# Altium footprint library LibPCB.PcbLib: 76 footprints (part 4 of 5)
Each footprint in its own frame and in the unit in brackets; x right, y up, seen from the top. Pads: shape width x height; smd on the part's side, far side on the other; paste and mask are expansions set on the pad; w line width, h text height; cw(c..) or ccw(c..) is an arc to the next point about the centre after c.
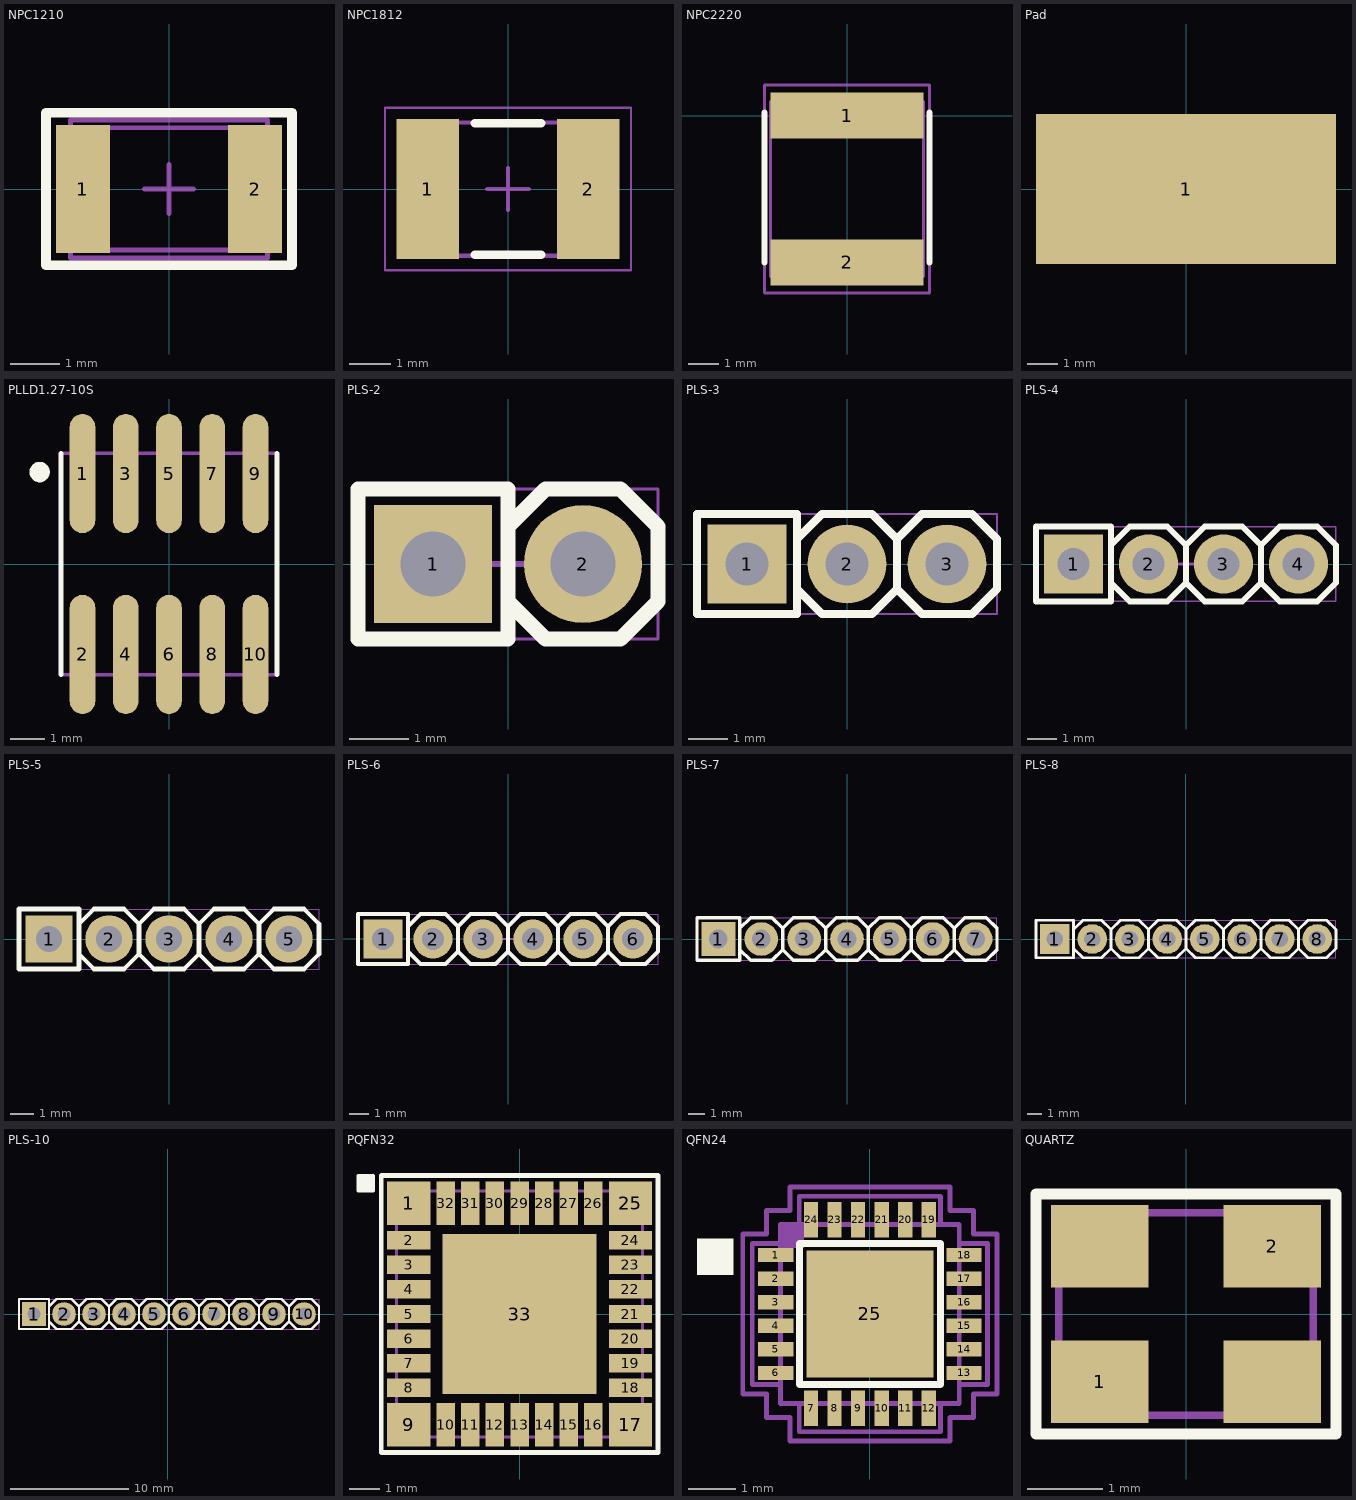
[diagram p3: the footprints below, top view; thin cyan lines are the x and y axes]

## NPC1210 [mm] "Non polar chip capacitor, size 1210"
height 2.5
pads (2):
  rect 1.1x2.6 smd: 1(-1.75,0) 2(1.75,0)
Top Overlay:
  lines w0.2: -2.5,-1.55 2.5,-1.55 2.5,1.55 -2.5,1.55 -2.5,-1.55
Mechanical 1:
  lines w0.1: -2,-1.244 -2,1.245 2,1.245 2,-1.244 -2,-1.244
Mechanical 9:
  text ".Comment" at -1.054,-0.651 h0.6
  text ".Designator" at -1.454,0.049 h0.8
Mechanical 11:
  lines w0.1: -2,-1.4 -2,1.4 2,1.4 2,-1.4 -2,-1.4
Mechanical 15:
  lines w0.1: -0.5,0 0.5,0 ; 0,-0.5 0,0.5
3D body "User Library-1210(3225M) Cap.STEP": height 1.7, standoff 0, extent -2,-1.244 2,1.245

## NPC1812 [mm] "Non polar chip capacitor, size 1812"
height 1.4
pads (2):
  rect 1.5x3.35 smd: 1(-1.925,0) 2(1.925,0)
Top Overlay:
  lines w0.2: -0.8,-1.575 0.8,-1.575 ; -0.8,1.575 0.8,1.575
Mechanical 1:
  lines w0.1: -2.25,-1.6 -2.25,1.6 2.25,1.6 2.25,-1.6 -2.25,-1.6
Mechanical 9:
  text ".Comment" at -1.054,-0.651 h0.6
  text ".Designator" at -1.454,0.049 h0.8
Mechanical 11:
  lines w0.05: -2.95,-1.95 -2.95,1.95 2.95,1.95 2.95,-1.95 -2.95,-1.95
Mechanical 15:
  lines w0.1: -0.5,0 0.5,0 ; 0,-0.5 0,0.5
3D body "SW3dPS-1812 SMD Capacitor.STEP": height 1.6, standoff 0, extent -2.25,-1.6 2.25,1.6

## NPC2220 [mm] "Non polar chip capacitor, size 2220"
pads (2):
  rect 5x1.5 smd: 1(0,0) 2(0,-4.8)
Top Overlay:
  lines w0.2: -2.7,-4.8 -2.7,0.1 ; 2.7,-4.8 2.7,0.1
Mechanical 1:
  lines w0.1: -2.5,-5.25 -2.5,0.45 2.5,0.45 2.5,-5.25 -2.5,-5.25
Mechanical 9:
  text ".Comment" at -1.054,-3.064 h0.6
  text ".Designator" at -1.454,-2.364 h0.8
Mechanical 11:
  lines w0.1: -2.7,-5.8 -2.7,1 -2,1 2.7,1 2.7,-5.8 -2.7,-5.8
3D body "User Library-CAPC5750X23.STEP": height 2.3, standoff 0, extent -2.5,-5.25 2.5,0.45

## Pad [mm]
pads (1):
  rect 10x5 smd mask+0: 1(0,0)

## PLLD1.27-10S [mm] "PLDD-1.27"
height 5
pads (10):
  oval 0.75x3.5 smd: 1(-2.54,2.655) 2(-2.54,-2.655) 3(-1.27,2.655) 4(-1.27,-2.655) 5(0,2.655) 6(0,-2.655) 7(1.27,2.655) 8(1.27,-2.655) 9(2.54,2.655) 10(2.54,-2.655)
Top Overlay:
  circle w0.3: c-3.8,2.7 r0.15
  lines w0.15: -3.175,-3.25 -3.175,3.25 ; 3.175,-3.25 3.175,3.25
Mechanical 7:
  lines w0.1: -3.175,-3.25 3.175,-3.25 3.175,3.25 -3.175,3.25 -3.175,-3.25
3D body: height 5, standoff 0, extent -3.175,-3.25 3.175,3.25

## PLS-2 [mm]
height 10
pads (2):
  rect 2x2 hole 1.1: 1(-1.27,0)
  round 2 hole 1.1: 2(1.27,0)
Top Overlay:
  lines w0.254: 0,-0.635 0.635,-1.27 1.905,-1.27 2.54,-0.635 2.54,0.635 1.905,1.27 0.635,1.27 0,0.635 ; -2.54,-1.27 -2.54,1.27 0,1.27 0,-1.27 -2.54,-1.27
Mechanical 1:
  lines w0.1: 0,-0.635 0.635,-1.27 1.905,-1.27 2.54,-0.635 2.54,0.635 1.905,1.27 0.635,1.27 0,0.635 ; -2.54,-1.27 0,-1.27 0,1.27 -2.54,1.27 -2.54,-1.27
Mechanical 15:
  lines w0.05: -2.54,-1.27 2.54,-1.27 2.54,1.27 -2.54,1.27 -2.54,-1.27
  lines w0.1: -0.5,0 0.5,0 ; 0,-0.5 0,0.5
3D body "PLS-2.STEP": height 8.54, standoff -3, extent -2.573,-1.284 2.507,1.256

## PLS-3 [mm]
height 10
pads (3):
  rect 2x2 hole 1.1: 1(-2.54,0)
  round 2 hole 1.1: 2(0,0) 3(2.54,0)
Top Overlay:
  lines w0.2: -1.27,-0.635 -0.635,-1.27 0.635,-1.27 1.27,-0.635 ; -1.27,0.635 -0.635,1.27 0.635,1.27 1.27,0.635 ; 1.27,-0.635 1.27,0.635 ; 1.27,-0.635 1.905,-1.27 3.175,-1.27 3.81,-0.635 3.81,0.635 3.175,1.27 1.905,1.27 1.27,0.635 ; -3.81,-1.27 -3.81,1.27 -1.27,1.27 -1.27,-1.27 -3.81,-1.27
Mechanical 1:
  lines w0.1: -1.27,-0.635 -0.635,-1.27 0.635,-1.27 1.27,-0.635 ; -1.27,0.635 -0.635,1.27 0.635,1.27 1.27,0.635 ; 1.27,-0.635 1.905,-1.27 3.175,-1.27 3.81,-0.635 3.81,0.635 3.175,1.27 1.905,1.27 1.27,0.635 ; 1.27,-0.635 1.27,0.635 ; -3.81,-1.27 -1.27,-1.27 -1.27,1.27 -3.81,1.27 -3.81,-1.27
Mechanical 15:
  lines w0.05: -3.81,-1.27 3.81,-1.27 3.81,1.27 -3.81,1.27 -3.81,-1.27
  lines w0.1: -0.5,0 0.5,0 ; 0,-0.5 0,0.5
3D body "PLS-3.STEP": height 8.54, standoff -3, extent -3.81,-1.27 3.81,1.27

## PLS-4 [mm]
height 10
pads (4):
  rect 2x2 hole 1.1: 1(-3.81,0)
  round 2 hole 1.1: 2(-1.27,0) 3(1.27,0) 4(3.81,0)
Top Overlay:
  lines w0.2: -2.54,-0.635 -1.905,-1.27 -0.635,-1.27 0,-0.635 ; -2.54,0.635 -1.905,1.27 -0.635,1.27 0,0.635 ; 0,-0.635 0,0.635 ; 0,-0.635 0.635,-1.27 1.905,-1.27 2.54,-0.635 ; 0,0.635 0.635,1.27 1.905,1.27 2.54,0.635 ; 2.54,-0.635 2.54,0.635 ; 2.54,-0.635 3.175,-1.27 4.445,-1.27 5.08,-0.635 5.08,0.635 4.445,1.27 3.175,1.27 2.54,0.635 ; -5.08,-1.27 -5.08,1.27 -2.54,1.27 -2.54,-1.27 -5.08,-1.27
Mechanical 1:
  lines w0.1: -2.54,-0.635 -1.905,-1.27 -0.635,-1.27 0,-0.635 ; -2.54,0.635 -1.905,1.27 -0.635,1.27 0,0.635 ; 0,-0.635 0.635,-1.27 1.905,-1.27 2.54,-0.635 ; 0,-0.635 0,0.635 ; 0,0.635 0.635,1.27 1.905,1.27 2.54,0.635 ; 2.54,-0.635 3.175,-1.27 4.445,-1.27 5.08,-0.635 5.08,0.635 4.445,1.27 3.175,1.27 2.54,0.635 ; 2.54,-0.635 2.54,0.635 ; -5.08,-1.27 -2.54,-1.27 -2.54,1.27 -5.08,1.27 -5.08,-1.27
Mechanical 15:
  lines w0.05: -5.08,-1.27 5.08,-1.27 5.08,1.27 -5.08,1.27 -5.08,-1.27
  lines w0.1: -0.5,0 0.5,0 ; 0,-0.5 0,0.5
3D body "PLS-4.STEP": height 8.54, standoff -3, extent -5.08,-1.27 5.08,1.27

## PLS-5 [mm]
height 10
pads (5):
  rect 2x2 hole 1.1: 1(-5.08,0)
  round 2 hole 1.1: 2(-2.54,0) 3(0,0) 4(2.54,0) 5(5.08,0)
Top Overlay:
  lines w0.2: -3.81,-0.635 -3.175,-1.27 -1.905,-1.27 -1.27,-0.635 ; -3.81,0.635 -3.175,1.27 -1.905,1.27 -1.27,0.635 ; -1.27,-0.635 -0.635,-1.27 0.635,-1.27 1.27,-0.635 ; -1.27,-0.635 -1.27,0.635 ; -1.27,0.635 -0.635,1.27 0.635,1.27 1.27,0.635 ; 1.27,-0.635 1.905,-1.27 3.175,-1.27 3.81,-0.635 ; 1.27,-0.635 1.27,0.635 ; 1.27,0.635 1.905,1.27 3.175,1.27 3.81,0.635 ; 3.81,-0.635 4.445,-1.27 5.715,-1.27 6.35,-0.635 6.35,0.635 5.715,1.27 4.445,1.27 3.81,0.635 ; 3.81,-0.635 3.81,0.635 ; -6.35,-1.27 -3.81,-1.27 -3.81,1.27 -6.35,1.27 -6.35,-1.27
Mechanical 1:
  lines w0.1: -3.81,-0.635 -3.175,-1.27 -1.905,-1.27 -1.27,-0.635 ; -3.81,0.635 -3.175,1.27 -1.905,1.27 -1.27,0.635 ; -1.27,-0.635 -1.27,0.635 ; -1.27,-0.635 -0.635,-1.27 0.635,-1.27 1.27,-0.635 ; -1.27,0.635 -0.635,1.27 0.635,1.27 1.27,0.635 ; 1.27,-0.635 1.27,0.635 ; 1.27,-0.635 1.905,-1.27 3.175,-1.27 3.81,-0.635 ; 1.27,0.635 1.905,1.27 3.175,1.27 3.81,0.635 ; 3.81,-0.635 3.81,0.635 ; 3.81,-0.635 4.445,-1.27 5.715,-1.27 6.35,-0.635 6.35,0.635 5.715,1.27 4.445,1.27 3.81,0.635 ; -6.35,-1.27 -6.35,1.27 -3.81,1.27 -3.81,-1.27 -6.35,-1.27
Mechanical 15:
  lines w0.05: -6.35,-1.27 -6.35,1.27 6.35,1.27 6.35,-1.27 -6.35,-1.27
  lines w0.1: -0.5,0 0.5,0 ; 0,-0.5 0,0.5
3D body "PLS-5.STEP": height 8.54, standoff -3, extent -6.35,-1.27 6.35,1.27

## PLS-6 [mm]
height 10
pads (6):
  rect 2x2 hole 1.1: 1(-6.35,0)
  round 2 hole 1.1: 2(-3.81,0) 3(-1.27,0) 4(1.27,0) 5(3.81,0) 6(6.35,0)
Top Overlay:
  lines w0.2: -5.08,-0.635 -4.445,-1.27 -3.175,-1.27 -2.54,-0.635 ; -5.08,0.635 -4.445,1.27 -3.175,1.27 -2.54,0.635 ; -2.54,-0.635 -2.54,0.635 ; -2.54,-0.635 -1.905,-1.27 -0.635,-1.27 0,-0.635 ; -2.54,0.635 -1.905,1.27 -0.635,1.27 0,0.635 ; 0,-0.635 0,0.635 ; 0,-0.635 0.635,-1.27 1.905,-1.27 2.54,-0.635 ; 0,0.635 0.635,1.27 1.905,1.27 2.54,0.635 ; 2.54,-0.635 2.54,0.635 ; 2.54,-0.635 3.175,-1.27 4.445,-1.27 5.08,-0.635 ; 2.54,0.635 3.175,1.27 4.445,1.27 5.08,0.635 ; 5.08,-0.635 5.715,-1.27 6.985,-1.27 7.62,-0.635 7.62,0.635 6.985,1.27 5.715,1.27 5.08,0.635 ; 5.08,-0.635 5.08,0.635 ; -7.62,-1.27 -7.62,1.27 -5.08,1.27 -5.08,-1.27 -7.62,-1.27
Mechanical 1:
  lines w0.1: -5.08,-0.635 -4.445,-1.27 -3.175,-1.27 -2.54,-0.635 ; -5.08,0.635 -4.445,1.27 -3.175,1.27 -2.54,0.635 ; -2.54,-0.635 -1.905,-1.27 -0.635,-1.27 0,-0.635 ; -2.54,-0.635 -2.54,0.635 ; -2.54,0.635 -1.905,1.27 -0.635,1.27 0,0.635 ; 0,-0.635 0.635,-1.27 1.905,-1.27 2.54,-0.635 ; 0,-0.635 0,0.635 ; 0,0.635 0.635,1.27 1.905,1.27 2.54,0.635 ; 2.54,-0.635 3.175,-1.27 4.445,-1.27 5.08,-0.635 ; 2.54,-0.635 2.54,0.635 ; 2.54,0.635 3.175,1.27 4.445,1.27 5.08,0.635 ; 5.08,-0.635 5.08,0.635 ; 5.08,-0.635 5.715,-1.27 6.985,-1.27 7.62,-0.635 7.62,0.635 6.985,1.27 5.715,1.27 5.08,0.635 ; -7.62,-1.27 -5.08,-1.27 -5.08,1.27 -7.62,1.27 -7.62,-1.27
Mechanical 15:
  lines w0.05: -7.62,-1.27 7.62,-1.27 7.62,1.27 -7.62,1.27 -7.62,-1.27
  lines w0.1: -0.5,0 0.5,0 ; 0,-0.5 0,0.5
3D body "PLS-6.STEP": height 8.54, standoff -3, extent -7.62,-1.27 7.62,1.27

## PLS-7 [mm]
height 10
pads (7):
  rect 2x2 hole 1.1: 1(-7.62,0)
  round 2 hole 1.1: 2(-5.08,0) 3(-2.54,0) 4(0,0) 5(2.54,0) 6(5.08,0) 7(7.62,0)
Top Overlay:
  lines w0.2: -6.35,-0.635 -5.715,-1.27 -4.445,-1.27 -3.81,-0.635 ; -6.35,0.635 -5.715,1.27 -4.445,1.27 -3.81,0.635 ; -3.81,-0.635 -3.175,-1.27 -1.905,-1.27 -1.27,-0.635 ; -3.81,-0.635 -3.81,0.635 ; -3.81,0.635 -3.175,1.27 -1.905,1.27 -1.27,0.635 ; -1.27,-0.635 -0.635,-1.27 0.635,-1.27 1.27,-0.635 ; -1.27,-0.635 -1.27,0.635 ; -1.27,0.635 -0.635,1.27 0.635,1.27 1.27,0.635 ; 1.27,-0.635 1.905,-1.27 3.175,-1.27 3.81,-0.635 ; 1.27,-0.635 1.27,0.635 ; 1.27,0.635 1.905,1.27 3.175,1.27 3.81,0.635 ; 3.81,-0.635 3.81,0.635 ; 3.81,-0.635 4.445,-1.27 5.715,-1.27 6.35,-0.635 ; 3.81,0.635 4.445,1.27 5.715,1.27 6.35,0.635 ; 6.35,-0.635 6.985,-1.27 8.255,-1.27 8.89,-0.635 8.89,0.635 8.255,1.27 6.985,1.27 6.35,0.635 ; 6.35,-0.635 6.35,0.635 ; -8.89,-1.27 -6.35,-1.27 -6.35,1.27 -8.89,1.27 -8.89,-1.27
Mechanical 1:
  lines w0.1: -6.35,-0.635 -5.715,-1.27 -4.445,-1.27 -3.81,-0.635 ; -6.35,0.635 -5.715,1.27 -4.445,1.27 -3.81,0.635 ; -3.81,-0.635 -3.81,0.635 ; -3.81,-0.635 -3.175,-1.27 -1.905,-1.27 -1.27,-0.635 ; -3.81,0.635 -3.175,1.27 -1.905,1.27 -1.27,0.635 ; -1.27,-0.635 -1.27,0.635 ; -1.27,-0.635 -0.635,-1.27 0.635,-1.27 1.27,-0.635 ; -1.27,0.635 -0.635,1.27 0.635,1.27 1.27,0.635 ; 1.27,-0.635 1.27,0.635 ; 1.27,-0.635 1.905,-1.27 3.175,-1.27 3.81,-0.635 ; 1.27,0.635 1.905,1.27 3.175,1.27 3.81,0.635 ; 3.81,-0.635 4.445,-1.27 5.715,-1.27 6.35,-0.635 ; 3.81,-0.635 3.81,0.635 ; 3.81,0.635 4.445,1.27 5.715,1.27 6.35,0.635 ; 6.35,-0.635 6.35,0.635 ; 6.35,-0.635 6.985,-1.27 8.255,-1.27 8.89,-0.635 8.89,0.635 8.255,1.27 6.985,1.27 6.35,0.635 ; -8.89,-1.27 -8.89,1.27 -6.35,1.27 -6.35,-1.27 -8.89,-1.27
Mechanical 15:
  lines w0.05: -8.89,-1.27 -8.89,1.27 8.89,1.27 8.89,-1.27 -8.89,-1.27
  lines w0.1: -0.5,0 0.5,0 ; 0,-0.5 0,0.5

## PLS-8 [mm]
height 10
pads (8):
  rect 2x2 hole 1.1: 1(-8.884,0.004)
  round 2 hole 1.1: 2(-6.344,0.004) 3(-3.804,0.004) 4(-1.264,0.004) 5(1.276,0.004) 6(3.816,0.004) 7(6.356,0.004) 8(8.896,0.004)
Top Overlay:
  lines w0.2: -7.614,-0.631 -6.979,-1.266 -5.709,-1.266 -5.074,-0.631 ; -7.614,0.639 -6.979,1.274 -5.709,1.274 -5.074,0.639 ; -5.074,-0.631 -5.074,0.639 ; -5.074,-0.631 -4.439,-1.266 -3.169,-1.266 -2.534,-0.631 ; -5.074,0.639 -4.439,1.274 -3.169,1.274 -2.534,0.639 ; -2.534,-0.631 -2.534,0.639 ; -2.534,-0.631 -1.899,-1.266 -0.629,-1.266 0.006,-0.631 ; -2.534,0.639 -1.899,1.274 -0.629,1.274 0.006,0.639 ; 0.006,-0.631 0.006,0.639 ; 0.006,-0.631 0.641,-1.266 1.911,-1.266 2.546,-0.631 ; 0.006,0.639 0.641,1.274 1.911,1.274 2.546,0.639 ; 2.546,-0.631 3.181,-1.266 4.451,-1.266 5.086,-0.631 ; 2.546,-0.631 2.546,0.639 ; 2.546,0.639 3.181,1.274 4.451,1.274 5.086,0.639 ; 5.086,-0.631 5.086,0.639 ; 5.086,-0.631 5.721,-1.266 6.991,-1.266 7.626,-0.631 ; 5.086,0.639 5.721,1.274 6.991,1.274 7.626,0.639 ; 7.626,-0.631 8.261,-1.266 9.531,-1.266 10.166,-0.631 10.166,0.639 9.531,1.274 8.261,1.274 7.626,0.639 ; 7.626,-0.631 7.626,0.639 ; -10.154,-1.266 -10.154,1.274 -7.614,1.274 -7.614,-1.266 -10.154,-1.266
Mechanical 1:
  lines w0.1: -7.614,-0.631 -6.979,-1.266 -5.709,-1.266 -5.074,-0.631 ; -7.614,0.639 -6.979,1.274 -5.709,1.274 -5.074,0.639 ; -5.074,-0.631 -4.439,-1.266 -3.169,-1.266 -2.534,-0.631 ; -5.074,-0.631 -5.074,0.639 ; -5.074,0.639 -4.439,1.274 -3.169,1.274 -2.534,0.639 ; -2.534,-0.631 -1.899,-1.266 -0.629,-1.266 0.006,-0.631 ; -2.534,-0.631 -2.534,0.639 ; -2.534,0.639 -1.899,1.274 -0.629,1.274 0.006,0.639 ; 0.006,-0.631 0.641,-1.266 1.911,-1.266 2.546,-0.631 ; 0.006,-0.631 0.006,0.639 ; 0.006,0.639 0.641,1.274 1.911,1.274 2.546,0.639 ; 2.546,-0.631 2.546,0.639 ; 2.546,-0.631 3.181,-1.266 4.451,-1.266 5.086,-0.631 ; 2.546,0.639 3.181,1.274 4.451,1.274 5.086,0.639 ; 5.086,-0.631 5.721,-1.266 6.991,-1.266 7.626,-0.631 ; 5.086,-0.631 5.086,0.639 ; 5.086,0.639 5.721,1.274 6.991,1.274 7.626,0.639 ; 7.626,-0.631 7.626,0.639 ; 7.626,-0.631 8.261,-1.266 9.531,-1.266 10.166,-0.631 10.166,0.639 9.531,1.274 8.261,1.274 7.626,0.639 ; -10.154,-1.266 -7.614,-1.266 -7.614,1.274 -10.154,1.274 -10.154,-1.266
Mechanical 15:
  lines w0.05: -10.154,-1.266 10.166,-1.266 10.166,1.274 -10.154,1.274 -10.154,-1.266
  lines w0.1: -0.494,0.004 0.506,0.004 ; 0.006,-0.496 0.006,0.504
3D body "PLS-8.STEP": height 8.54, standoff -3, extent -10.154,-1.266 10.166,1.274

## PLS-10 [mm] "PLS-40 10 pin header"
height 10
pads (10):
  rect 2x2 hole 1.1: 1(-11.303,0)
  round 2 hole 1.1: 2(-8.763,0) 3(-6.223,0) 4(-3.683,0) 5(-1.143,0) 6(1.397,0) 7(3.937,0) 8(6.477,0) 9(9.017,0) 10(11.557,0)
Top Overlay:
  lines w0.2: -10.033,-0.635 -9.398,-1.27 -8.128,-1.27 -7.493,-0.635 ; -10.033,0.635 -9.398,1.27 -8.128,1.27 -7.493,0.635 ; -7.493,-0.635 -7.493,0.635 ; -7.493,-0.635 -6.858,-1.27 -5.588,-1.27 -4.953,-0.635 ; -7.493,0.635 -6.858,1.27 -5.588,1.27 -4.953,0.635 ; -4.953,-0.635 -4.953,0.635 ; -4.953,-0.635 -4.318,-1.27 -3.048,-1.27 -2.413,-0.635 ; -4.953,0.635 -4.318,1.27 -3.048,1.27 -2.413,0.635 ; -2.413,-0.635 -2.413,0.635 ; -2.413,-0.635 -1.778,-1.27 -0.508,-1.27 0.127,-0.635 ; -2.413,0.635 -1.778,1.27 -0.508,1.27 0.127,0.635 ; 0.127,-0.635 0.762,-1.27 2.032,-1.27 2.667,-0.635 ; 0.127,-0.635 0.127,0.635 ; 0.127,0.635 0.762,1.27 2.032,1.27 2.667,0.635 ; 2.667,-0.635 2.667,0.635 ; 2.667,-0.635 3.302,-1.27 4.572,-1.27 5.207,-0.635 ; 2.667,0.635 3.302,1.27 4.572,1.27 5.207,0.635 ; 5.207,-0.635 5.842,-1.27 7.112,-1.27 7.747,-0.635 ; 5.207,-0.635 5.207,0.635 ; 5.207,0.635 5.842,1.27 7.112,1.27 7.747,0.635 ; 7.747,-0.635 8.382,-1.27 9.652,-1.27 10.287,-0.635 ; 7.747,-0.635 7.747,0.635 ; 7.747,0.635 8.382,1.27 9.652,1.27 10.287,0.635 ; 10.287,-0.635 10.922,-1.27 12.192,-1.27 12.827,-0.635 12.827,0.635 12.192,1.27 10.922,1.27 10.287,0.635 ; 10.287,-0.635 10.287,0.635 ; -12.573,-1.27 -12.573,1.27 -10.033,1.27 -10.033,-1.27 -12.573,-1.27
Mechanical 1:
  lines w0.1: -10.033,-0.635 -9.398,-1.27 -8.128,-1.27 -7.493,-0.635 ; -10.033,0.635 -9.398,1.27 -8.128,1.27 -7.493,0.635 ; -7.493,-0.635 -6.858,-1.27 -5.588,-1.27 -4.953,-0.635 ; -7.493,-0.635 -7.493,0.635 ; -7.493,0.635 -6.858,1.27 -5.588,1.27 -4.953,0.635 ; -4.953,-0.635 -4.318,-1.27 -3.048,-1.27 -2.413,-0.635 ; -4.953,-0.635 -4.953,0.635 ; -4.953,0.635 -4.318,1.27 -3.048,1.27 -2.413,0.635 ; -2.413,-0.635 -1.778,-1.27 -0.508,-1.27 0.127,-0.635 ; -2.413,-0.635 -2.413,0.635 ; -2.413,0.635 -1.778,1.27 -0.508,1.27 0.127,0.635 ; 0.127,-0.635 0.127,0.635 ; 0.127,-0.635 0.762,-1.27 2.032,-1.27 2.667,-0.635 ; 0.127,0.635 0.762,1.27 2.032,1.27 2.667,0.635 ; 2.667,-0.635 3.302,-1.27 4.572,-1.27 5.207,-0.635 ; 2.667,-0.635 2.667,0.635 ; 2.667,0.635 3.302,1.27 4.572,1.27 5.207,0.635 ; 5.207,-0.635 5.207,0.635 ; 5.207,-0.635 5.842,-1.27 7.112,-1.27 7.747,-0.635 ; 5.207,0.635 5.842,1.27 7.112,1.27 7.747,0.635 ; 7.747,-0.635 7.747,0.635 ; 7.747,-0.635 8.382,-1.27 9.652,-1.27 10.287,-0.635 ; 7.747,0.635 8.382,1.27 9.652,1.27 10.287,0.635 ; 10.287,-0.635 10.287,0.635 ; 10.287,-0.635 10.922,-1.27 12.192,-1.27 12.827,-0.635 12.827,0.635 12.192,1.27 10.922,1.27 10.287,0.635 ; -12.573,-1.27 -10.033,-1.27 -10.033,1.27 -12.573,1.27 -12.573,-1.27
Mechanical 15:
  lines w0.05: -12.573,-1.27 12.827,-1.27 12.827,1.27 -12.573,1.27 -12.573,-1.27
  lines w0.1: -0.373,0 0.627,0 ; 0.127,-0.5 0.127,0.5
3D body "PLS-10.STEP": height 8.54, standoff -3, extent -12.573,-1.27 12.827,1.27

## PQFN32 [mm]
pads (33):
  rect 1.4x1.4 smd mask+0: 1(-3.6,3.6) 9(-3.6,-3.6) 17(3.6,-3.6) 25(3.6,3.6)
  rect 1.4x0.6 smd mask+0: 2(-3.6,2.4) 3(-3.6,1.6) 4(-3.6,0.8) 5(-3.6,0) 6(-3.6,-0.8) 7(-3.6,-1.6) 8(-3.6,-2.4) 18(3.6,-2.4) 19(3.6,-1.6) 20(3.6,-0.8) 21(3.6,0) 22(3.6,0.8) 23(3.6,1.6) 24(3.6,2.4)
  rect 0.6x1.4 smd mask+0: 10(-2.4,-3.6) 11(-1.6,-3.6) 12(-0.8,-3.6) 13(0,-3.6) 14(0.8,-3.6) 15(1.6,-3.6) 16(2.4,-3.6) 26(2.4,3.6) 27(1.6,3.6) 28(0.8,3.6) 29(0,3.6) 30(-0.8,3.6) 31(-1.6,3.6) 32(-2.4,3.6)
  rect 5x5.2 smd mask+0: 33(0,0)
Top Overlay:
  rectangle: -5.25,4 -4.75,4.5
  lines w0.1: -5.25,4 -5.25,4.5 -4.75,4.5 -4.75,4 -5.25,4
  lines w0.15: -4.5,-4.5 -4.5,4.5 4.5,4.5 4.5,-4.5 -4.5,-4.5
Mechanical 9:
  text ".Comment" at 1.5,-5.5 h0.6
  text ".Designator" at -0.5,5 h0.8
Mechanical 11:
  rectangle: -4,3 -3,4
  lines w0.1: -4,3 -3,3 -3,4 ; -4,-4 -4,4 4,4 4,-4 -4,-4
3D body "MC33926 8X8X2.STEP": height 2.1, standoff -0.05, extent -4,-4 4,4

## QFN24 [mm]
height 1
pads (25):
  rect 0.75x0.3 smd: 1(-2,1.25) 2(-2,0.75) 3(-2,0.25) 4(-2,-0.25) 5(-2,-0.75) 6(-2,-1.25) 13(2,-1.25) 14(2,-0.75) 15(2,-0.25) 16(2,0.25) 17(2,0.75) 18(2,1.25)
  rect 0.3x0.75 smd: 7(-1.25,-2) 8(-0.75,-2) 9(-0.25,-2) 10(0.25,-2) 11(0.75,-2) 12(1.25,-2) 19(1.25,2) 20(0.75,2) 21(0.25,2) 22(-0.25,2) 23(-0.75,2) 24(-1.25,2)
  rect 2.7x2.7 smd: 25(0,0)
Top Overlay:
  region: -3.675,1.6 -3.675,0.825 -2.9,0.825 -2.9,1.6
  lines w0.15: -1.5,-1.5 1.5,-1.5 1.5,1.5 -1.5,1.5 -1.5,-1.5
Mechanical 9:
  text ".Comment" at -1.025,3.225 h0.6
  text ".Designator" at -1.425,3.925 h0.8
Mechanical 11:
  region: -1.9,1.9 -1.9,1.4 -1.4,1.4 -1.4,1.9
  lines w0.1: -1.9,-1.5 -2.5,-1.5 -2.5,1.5 -1.9,1.5 ; -1.5,-1.9 -1.5,-2.5 1.5,-2.5 1.5,-1.9 ; -1.5,1.9 -1.5,2.5 1.5,2.5 1.5,1.9 ; 1.9,-1.5 2.5,-1.5 2.5,1.5 1.9,1.5 ; -1.9,-1.9 1.9,-1.9 1.9,1.9 -1.9,1.9 -1.9,-1.9
Mechanical 15:
  lines w0.1: -0.3,0 0,0 ; 0,-0.3 0,0 ; 0,0.3 0,0 ; 0.3,0 0,0 ; -2.7,-1.7 -2.2,-1.7 -2.2,-2.2 -1.7,-2.2 -1.7,-2.7 1.7,-2.7 1.7,-2.2 2.2,-2.2 2.2,-1.7 2.7,-1.7 2.7,1.5 2.7,1.7 2.2,1.7 2.2,2.2 1.7,2.2 1.7,2.7 -1.7,2.7 -1.7,2.2 -2.2,2.2 -2.2,1.7 -2.7,1.7 -2.7,-1.7
3D body "User Library-QFN24-0_5.STEP": height 1, standoff 0, extent -2,-2 2,2

## QUARTZ [mm]
height 1.2
pads (4):
  rect 1.3x1.1 smd: 1(-1.15,-0.9) 2(1.15,0.9) ""(-1.15,0.9) ""(1.15,-0.9)
Top Overlay:
  lines w0.15: -2,-1.6 2,-1.6 2,1.6 -2,1.6 -2,-1.6
Mechanical 9:
  text ".Designator" at -1.4,2.7 h0.8
  text ".Comment" at -1,2 h0.6
Mechanical 11:
  lines w0.1: -1.7,-0.75 -1.1,-1.35 ; -1.25,-1.163 -0.95,-1.35 ; -1.225,-1.325 -1.675,-0.875 -1.675,-0.825 -1.175,-1.325 ; -1.1,-1.35 -1.7,-0.6 -0.95,-1.35 ; -1.1,-1.35 -0.95,-1.35 ; -1.7,-1.35 1.7,-1.35 1.7,1.35 -1.7,1.35 -1.7,-1.35
Mechanical 15:
  lines w0.1: -2,-1.6 2,-1.6 2,1.6 -2,1.6 -2,-1.6
3D body "User Library-GeyerElectronics_KX7.STEP": height 0.81, standoff 0, extent -1.607,-1.25 1.607,1.25